# Altium footprint library texas.PCBLIB: 124 footprints (part 12 of 12)
Each footprint in its own frame and in the unit in brackets; x right, y up, seen from the top. Pads: shape width x height; smd on the part's side, far side on the other; paste and mask are expansions set on the pad; w line width, h text height; cw(c..) or ccw(c..) is an arc to the next point about the centre after c.
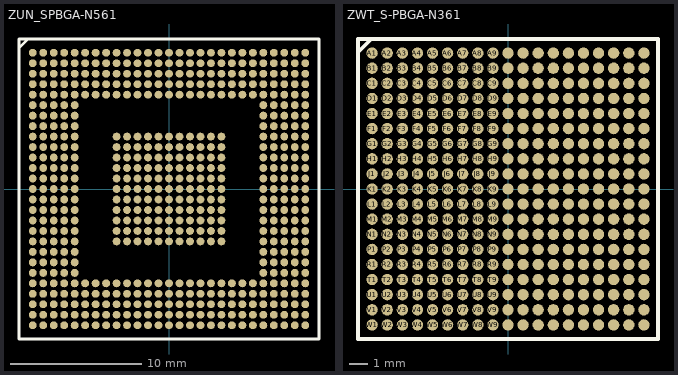
[diagram p11: the footprints below, top view; thin cyan lines are the x and y axes]

## ZUN_SPBGA-N561 [mm]
pads (561):
  rrect100% 0.6x0.6 smd: A1(-10.4,10.4) A2(-9.6,10.4) A3(-8.8,10.4) A4(-8,10.4) A5(-7.2,10.4) A6(-6.4,10.4) A7(-5.6,10.4) A8(-4.8,10.4) A9(-4,10.4) A10(-3.2,10.4) A11(-2.4,10.4) A12(-1.6,10.4) A13(-0.8,10.4) A14(0,10.4) A15(0.8,10.4) A16(1.6,10.4) A17(2.4,10.4) A18(3.2,10.4) A19(4,10.4) A20(4.8,10.4) A21(5.6,10.4) A22(6.4,10.4) A23(7.2,10.4) A24(8,10.4) A25(8.8,10.4) A26(9.6,10.4) A27(10.4,10.4) AA1(-10.4,-5.6) AA2(-9.6,-5.6) AA3(-8.8,-5.6) AA4(-8,-5.6) AA5(-7.2,-5.6) AA23(7.2,-5.6) AA24(8,-5.6) AA25(8.8,-5.6) AA26(9.6,-5.6) AA27(10.4,-5.6) AB1(-10.4,-6.4) AB2(-9.6,-6.4) AB3(-8.8,-6.4) AB4(-8,-6.4) AB5(-7.2,-6.4) AB23(7.2,-6.4) AB24(8,-6.4) AB25(8.8,-6.4) AB26(9.6,-6.4) AB27(10.4,-6.4) AC1(-10.4,-7.2) AC2(-9.6,-7.2) AC3(-8.8,-7.2) AC4(-8,-7.2) AC5(-7.2,-7.2) AC6(-6.4,-7.2) AC7(-5.6,-7.2) AC8(-4.8,-7.2) AC9(-4,-7.2) AC10(-3.2,-7.2) AC11(-2.4,-7.2) AC12(-1.6,-7.2) AC13(-0.8,-7.2) AC14(0,-7.2) AC15(0.8,-7.2) AC16(1.6,-7.2) AC17(2.4,-7.2) AC18(3.2,-7.2) AC19(4,-7.2) AC20(4.8,-7.2) AC21(5.6,-7.2) AC22(6.4,-7.2) AC23(7.2,-7.2) AC24(8,-7.2) AC25(8.8,-7.2) AC26(9.6,-7.2) AC27(10.4,-7.2) AD1(-10.4,-8) AD2(-9.6,-8) AD3(-8.8,-8) AD4(-8,-8) AD5(-7.2,-8) AD6(-6.4,-8) AD7(-5.6,-8) AD8(-4.8,-8) AD9(-4,-8) AD10(-3.2,-8) AD11(-2.4,-8) AD12(-1.6,-8) AD13(-0.8,-8) AD14(0,-8) AD15(0.8,-8) AD16(1.6,-8) AD17(2.4,-8) AD18(3.2,-8) AD19(4,-8) AD20(4.8,-8) AD21(5.6,-8) AD22(6.4,-8) AD23(7.2,-8) AD24(8,-8) AD25(8.8,-8) AD26(9.6,-8) AD27(10.4,-8) AE1(-10.4,-8.8) AE2(-9.6,-8.8) AE3(-8.8,-8.8) AE4(-8,-8.8) AE5(-7.2,-8.8) AE6(-6.4,-8.8) AE7(-5.6,-8.8) AE8(-4.8,-8.8) AE9(-4,-8.8) AE10(-3.2,-8.8) AE11(-2.4,-8.8) AE12(-1.6,-8.8) AE13(-0.8,-8.8) AE14(0,-8.8) AE15(0.8,-8.8) AE16(1.6,-8.8) AE17(2.4,-8.8) AE18(3.2,-8.8) AE19(4,-8.8) AE20(4.8,-8.8) AE21(5.6,-8.8) AE22(6.4,-8.8) AE23(7.2,-8.8) AE24(8,-8.8) AE25(8.8,-8.8) AE26(9.6,-8.8) AE27(10.4,-8.8) AF1(-10.4,-9.6) AF2(-9.6,-9.6) AF3(-8.8,-9.6) AF4(-8,-9.6) AF5(-7.2,-9.6) AF6(-6.4,-9.6) AF7(-5.6,-9.6) AF8(-4.8,-9.6) AF9(-4,-9.6) AF10(-3.2,-9.6) AF11(-2.4,-9.6) AF12(-1.6,-9.6) AF13(-0.8,-9.6) AF14(0,-9.6) AF15(0.8,-9.6) AF16(1.6,-9.6) AF17(2.4,-9.6) AF18(3.2,-9.6) AF19(4,-9.6) AF20(4.8,-9.6) AF21(5.6,-9.6) AF22(6.4,-9.6) AF23(7.2,-9.6) AF24(8,-9.6) AF25(8.8,-9.6) AF26(9.6,-9.6) AF27(10.4,-9.6) AG1(-10.4,-10.4) AG2(-9.6,-10.4) AG3(-8.8,-10.4) AG4(-8,-10.4) AG5(-7.2,-10.4) AG6(-6.4,-10.4) AG7(-5.6,-10.4) AG8(-4.8,-10.4) AG9(-4,-10.4) AG10(-3.2,-10.4) AG11(-2.4,-10.4) AG12(-1.6,-10.4) AG13(-0.8,-10.4) AG14(0,-10.4) AG15(0.8,-10.4) AG16(1.6,-10.4) AG17(2.4,-10.4) AG18(3.2,-10.4) AG19(4,-10.4) AG20(4.8,-10.4) AG21(5.6,-10.4) AG22(6.4,-10.4) AG23(7.2,-10.4) AG24(8,-10.4) AG25(8.8,-10.4) AG26(9.6,-10.4) AG27(10.4,-10.4) B1(-10.4,9.6) B2(-9.6,9.6) B3(-8.8,9.6) B4(-8,9.6) B5(-7.2,9.6) B6(-6.4,9.6) B7(-5.6,9.6) B8(-4.8,9.6) B9(-4,9.6) B10(-3.2,9.6) B11(-2.4,9.6) B12(-1.6,9.6) B13(-0.8,9.6) B14(0,9.6) B15(0.8,9.6) B16(1.6,9.6) B17(2.4,9.6) B18(3.2,9.6) B19(4,9.6) B20(4.8,9.6) B21(5.6,9.6) B22(6.4,9.6) B23(7.2,9.6) B24(8,9.6) B25(8.8,9.6) B26(9.6,9.6) B27(10.4,9.6) C1(-10.4,8.8) C2(-9.6,8.8) C3(-8.8,8.8) C4(-8,8.8) C5(-7.2,8.8) C6(-6.4,8.8) C7(-5.6,8.8) C8(-4.8,8.8) C9(-4,8.8) C10(-3.2,8.8) C11(-2.4,8.8) C12(-1.6,8.8) C13(-0.8,8.8) C14(0,8.8) C15(0.8,8.8) C16(1.6,8.8) C17(2.4,8.8) C18(3.2,8.8) C19(4,8.8) C20(4.8,8.8) C21(5.6,8.8) C22(6.4,8.8) C23(7.2,8.8) C24(8,8.8) C25(8.8,8.8) C26(9.6,8.8) C27(10.4,8.8) D1(-10.4,8) D2(-9.6,8) D3(-8.8,8) D4(-8,8) D5(-7.2,8) D6(-6.4,8) D7(-5.6,8) D8(-4.8,8) D9(-4,8) D10(-3.2,8) D11(-2.4,8) D12(-1.6,8) D13(-0.8,8) D14(0,8) D15(0.8,8) D16(1.6,8) D17(2.4,8) D18(3.2,8) D19(4,8) D20(4.8,8) D21(5.6,8) D22(6.4,8) D23(7.2,8) D24(8,8) D25(8.8,8) D26(9.6,8) D27(10.4,8) E1(-10.4,7.2) E2(-9.6,7.2) E3(-8.8,7.2) E4(-8,7.2) E5(-7.2,7.2) E6(-6.4,7.2) E7(-5.6,7.2) E8(-4.8,7.2) E9(-4,7.2) E10(-3.2,7.2) E11(-2.4,7.2) E12(-1.6,7.2) E13(-0.8,7.2) E14(0,7.2) E15(0.8,7.2) E16(1.6,7.2) E17(2.4,7.2) E18(3.2,7.2) E19(4,7.2) E20(4.8,7.2) E21(5.6,7.2) E22(6.4,7.2) E23(7.2,7.2) E24(8,7.2) E25(8.8,7.2) E26(9.6,7.2) E27(10.4,7.2) F1(-10.4,6.4) F2(-9.6,6.4) F3(-8.8,6.4) F4(-8,6.4) F5(-7.2,6.4) F23(7.2,6.4) F24(8,6.4) F25(8.8,6.4) F26(9.6,6.4) F27(10.4,6.4) G1(-10.4,5.6) G2(-9.6,5.6) G3(-8.8,5.6) G4(-8,5.6) G5(-7.2,5.6) G23(7.2,5.6) G24(8,5.6) G25(8.8,5.6) G26(9.6,5.6) G27(10.4,5.6) H1(-10.4,4.8) H2(-9.6,4.8) H3(-8.8,4.8) H4(-8,4.8) H5(-7.2,4.8) H23(7.2,4.8) H24(8,4.8) H25(8.8,4.8) H26(9.6,4.8) H27(10.4,4.8) J1(-10.4,4) J2(-9.6,4) J3(-8.8,4) J4(-8,4) J5(-7.2,4) J9(-4,4) J10(-3.2,4) J11(-2.4,4) J12(-1.6,4) J13(-0.8,4) J14(0,4) J15(0.8,4) J16(1.6,4) J17(2.4,4) J18(3.2,4) J19(4,4) J23(7.2,4) J24(8,4) J25(8.8,4) J26(9.6,4) J27(10.4,4) K1(-10.4,3.2) K2(-9.6,3.2) K3(-8.8,3.2) K4(-8,3.2) K5(-7.2,3.2) K9(-4,3.2) K10(-3.2,3.2) K11(-2.4,3.2) K12(-1.6,3.2) K13(-0.8,3.2) K14(0,3.2) K15(0.8,3.2) K16(1.6,3.2) K17(2.4,3.2) K18(3.2,3.2) K19(4,3.2) K23(7.2,3.2) K24(8,3.2) K25(8.8,3.2) K26(9.6,3.2) K27(10.4,3.2) L1(-10.4,2.4) L2(-9.6,2.4) L3(-8.8,2.4) L4(-8,2.4) L5(-7.2,2.4) L9(-4,2.4) L10(-3.2,2.4) L11(-2.4,2.4) L12(-1.6,2.4) L13(-0.8,2.4) L14(0,2.4) L15(0.8,2.4) L16(1.6,2.4) L17(2.4,2.4) L18(3.2,2.4) L19(4,2.4) L23(7.2,2.4) L24(8,2.4) L25(8.8,2.4) L26(9.6,2.4) L27(10.4,2.4) M1(-10.4,1.6) M2(-9.6,1.6) M3(-8.8,1.6) M4(-8,1.6) M5(-7.2,1.6) M9(-4,1.6) M10(-3.2,1.6) M11(-2.4,1.6) M12(-1.6,1.6) M13(-0.8,1.6) M14(0,1.6) M15(0.8,1.6) M16(1.6,1.6) M17(2.4,1.6) M18(3.2,1.6) M19(4,1.6) M23(7.2,1.6) M24(8,1.6) M25(8.8,1.6) M26(9.6,1.6) M27(10.4,1.6) N1(-10.4,0.8) N2(-9.6,0.8) N3(-8.8,0.8) N4(-8,0.8) N5(-7.2,0.8) N9(-4,0.8) N10(-3.2,0.8) N11(-2.4,0.8) N12(-1.6,0.8) N13(-0.8,0.8) N14(0,0.8) N15(0.8,0.8) N16(1.6,0.8) N17(2.4,0.8) N18(3.2,0.8) N19(4,0.8) N23(7.2,0.8) N24(8,0.8) N25(8.8,0.8) N26(9.6,0.8) N27(10.4,0.8) P1(-10.4,0) P2(-9.6,0) P3(-8.8,0) P4(-8,0) P5(-7.2,0) P9(-4,0) P10(-3.2,0) P11(-2.4,0) P12(-1.6,0) P13(-0.8,0) P14(0,0) P15(0.8,0) P16(1.6,0) P17(2.4,0) P18(3.2,0) P19(4,0) P23(7.2,0) P24(8,0) P25(8.8,0) P26(9.6,0) P27(10.4,0) R1(-10.4,-0.8) R2(-9.6,-0.8) R3(-8.8,-0.8) R4(-8,-0.8) R5(-7.2,-0.8) R9(-4,-0.8) R10(-3.2,-0.8) R11(-2.4,-0.8) R12(-1.6,-0.8) R13(-0.8,-0.8) R14(0,-0.8) R15(0.8,-0.8) R16(1.6,-0.8) R17(2.4,-0.8) R18(3.2,-0.8) R19(4,-0.8) R23(7.2,-0.8) R24(8,-0.8) R25(8.8,-0.8) R26(9.6,-0.8) R27(10.4,-0.8) T1(-10.4,-1.6) T2(-9.6,-1.6) T3(-8.8,-1.6) T4(-8,-1.6) T5(-7.2,-1.6) T9(-4,-1.6) T10(-3.2,-1.6) T11(-2.4,-1.6) T12(-1.6,-1.6) T13(-0.8,-1.6) T14(0,-1.6) T15(0.8,-1.6) T16(1.6,-1.6) T17(2.4,-1.6) T18(3.2,-1.6) T19(4,-1.6) T23(7.2,-1.6) T24(8,-1.6) T25(8.8,-1.6) T26(9.6,-1.6) T27(10.4,-1.6) U1(-10.4,-2.4) U2(-9.6,-2.4) U3(-8.8,-2.4) U4(-8,-2.4) U5(-7.2,-2.4) U9(-4,-2.4) U10(-3.2,-2.4) U11(-2.4,-2.4) U12(-1.6,-2.4) U13(-0.8,-2.4) U14(0,-2.4) U15(0.8,-2.4) U16(1.6,-2.4) U17(2.4,-2.4) U18(3.2,-2.4) U19(4,-2.4) U23(7.2,-2.4) U24(8,-2.4) U25(8.8,-2.4) U26(9.6,-2.4) U27(10.4,-2.4) V1(-10.4,-3.2) V2(-9.6,-3.2) V3(-8.8,-3.2) V4(-8,-3.2) V5(-7.2,-3.2) V9(-4,-3.2) V10(-3.2,-3.2) V11(-2.4,-3.2) V12(-1.6,-3.2) V13(-0.8,-3.2) V14(0,-3.2) V15(0.8,-3.2) V16(1.6,-3.2) V17(2.4,-3.2) V18(3.2,-3.2) V19(4,-3.2) V23(7.2,-3.2) V24(8,-3.2) V25(8.8,-3.2) V26(9.6,-3.2) V27(10.4,-3.2) W1(-10.4,-4) W2(-9.6,-4) W3(-8.8,-4) W4(-8,-4) W5(-7.2,-4) W9(-4,-4) W10(-3.2,-4) W11(-2.4,-4) W12(-1.6,-4) W13(-0.8,-4) W14(0,-4) W15(0.8,-4) W16(1.6,-4) W17(2.4,-4) W18(3.2,-4) W19(4,-4) W23(7.2,-4) W24(8,-4) W25(8.8,-4) W26(9.6,-4) W27(10.4,-4) Y1(-10.4,-4.8) Y2(-9.6,-4.8) Y3(-8.8,-4.8) Y4(-8,-4.8) Y5(-7.2,-4.8) Y23(7.2,-4.8) Y24(8,-4.8) Y25(8.8,-4.8) Y26(9.6,-4.8) Y27(10.4,-4.8)
Top Overlay:
  lines w0.203: -11.448,10.75 -11.448,11.448 -10.75,11.448 ; -11.448,10.75 -11.448,-11.448 11.448,-11.448 11.448,11.448 -10.75,11.448 ; -11.448,10.75 -10.75,11.448
Top Solder:
  drawing of 561 lines, arcs and shapes, not listed

## ZWT_S-PBGA-N361 [mm]
pads (361):
  rrect100% 0.6x0.6 smd: A1(-7.2,7.2) A2(-6.4,7.2) A3(-5.6,7.2) A4(-4.8,7.2) A5(-4,7.2) A6(-3.2,7.2) A7(-2.4,7.2) A8(-1.6,7.2) A9(-0.8,7.2) A10(0,7.2) A11(0.8,7.2) A12(1.6,7.2) A13(2.4,7.2) A14(3.2,7.2) A15(4,7.2) A16(4.8,7.2) A17(5.6,7.2) A18(6.4,7.2) A19(7.2,7.2) B1(-7.2,6.4) B2(-6.4,6.4) B3(-5.6,6.4) B4(-4.8,6.4) B5(-4,6.4) B6(-3.2,6.4) B7(-2.4,6.4) B8(-1.6,6.4) B9(-0.8,6.4) B10(0,6.4) B11(0.8,6.4) B12(1.6,6.4) B13(2.4,6.4) B14(3.2,6.4) B15(4,6.4) B16(4.8,6.4) B17(5.6,6.4) B18(6.4,6.4) B19(7.2,6.4) C1(-7.2,5.6) C2(-6.4,5.6) C3(-5.6,5.6) C4(-4.8,5.6) C5(-4,5.6) C6(-3.2,5.6) C7(-2.4,5.6) C8(-1.6,5.6) C9(-0.8,5.6) C10(0,5.6) C11(0.8,5.6) C12(1.6,5.6) C13(2.4,5.6) C14(3.2,5.6) C15(4,5.6) C16(4.8,5.6) C17(5.6,5.6) C18(6.4,5.6) C19(7.2,5.6) D1(-7.2,4.8) D2(-6.4,4.8) D3(-5.6,4.8) D4(-4.8,4.8) D5(-4,4.8) D6(-3.2,4.8) D7(-2.4,4.8) D8(-1.6,4.8) D9(-0.8,4.8) D10(0,4.8) D11(0.8,4.8) D12(1.6,4.8) D13(2.4,4.8) D14(3.2,4.8) D15(4,4.8) D16(4.8,4.8) D17(5.6,4.8) D18(6.4,4.8) D19(7.2,4.8) E1(-7.2,4) E2(-6.4,4) E3(-5.6,4) E4(-4.8,4) E5(-4,4) E6(-3.2,4) E7(-2.4,4) E8(-1.6,4) E9(-0.8,4) E10(0,4) E11(0.8,4) E12(1.6,4) E13(2.4,4) E14(3.2,4) E15(4,4) E16(4.8,4) E17(5.6,4) E18(6.4,4) E19(7.2,4) F1(-7.2,3.2) F2(-6.4,3.2) F3(-5.6,3.2) F4(-4.8,3.2) F5(-4,3.2) F6(-3.2,3.2) F7(-2.4,3.2) F8(-1.6,3.2) F9(-0.8,3.2) F10(0,3.2) F11(0.8,3.2) F12(1.6,3.2) F13(2.4,3.2) F14(3.2,3.2) F15(4,3.2) F16(4.8,3.2) F17(5.6,3.2) F18(6.4,3.2) F19(7.2,3.2) G1(-7.2,2.4) G2(-6.4,2.4) G3(-5.6,2.4) G4(-4.8,2.4) G5(-4,2.4) G6(-3.2,2.4) G7(-2.4,2.4) G8(-1.6,2.4) G9(-0.8,2.4) G10(0,2.4) G11(0.8,2.4) G12(1.6,2.4) G13(2.4,2.4) G14(3.2,2.4) G15(4,2.4) G16(4.8,2.4) G17(5.6,2.4) G18(6.4,2.4) G19(7.2,2.4) H1(-7.2,1.6) H2(-6.4,1.6) H3(-5.6,1.6) H4(-4.8,1.6) H5(-4,1.6) H6(-3.2,1.6) H7(-2.4,1.6) H8(-1.6,1.6) H9(-0.8,1.6) H10(0,1.6) H11(0.8,1.6) H12(1.6,1.6) H13(2.4,1.6) H14(3.2,1.6) H15(4,1.6) H16(4.8,1.6) H17(5.6,1.6) H18(6.4,1.6) H19(7.2,1.6) J1(-7.2,0.8) J2(-6.4,0.8) J3(-5.6,0.8) J4(-4.8,0.8) J5(-4,0.8) J6(-3.2,0.8) J7(-2.4,0.8) J8(-1.6,0.8) J9(-0.8,0.8) J10(0,0.8) J11(0.8,0.8) J12(1.6,0.8) J13(2.4,0.8) J14(3.2,0.8) J15(4,0.8) J16(4.8,0.8) J17(5.6,0.8) J18(6.4,0.8) J19(7.2,0.8) K1(-7.2,0) K2(-6.4,0) K3(-5.6,0) K4(-4.8,0) K5(-4,0) K6(-3.2,0) K7(-2.4,0) K8(-1.6,0) K9(-0.8,0) K10(0,0) K11(0.8,0) K12(1.6,0) K13(2.4,0) K14(3.2,0) K15(4,0) K16(4.8,0) K17(5.6,0) K18(6.4,0) K19(7.2,0) L1(-7.2,-0.8) L2(-6.4,-0.8) L3(-5.6,-0.8) L4(-4.8,-0.8) L5(-4,-0.8) L6(-3.2,-0.8) L7(-2.4,-0.8) L8(-1.6,-0.8) L9(-0.8,-0.8) L10(0,-0.8) L11(0.8,-0.8) L12(1.6,-0.8) L13(2.4,-0.8) L14(3.2,-0.8) L15(4,-0.8) L16(4.8,-0.8) L17(5.6,-0.8) L18(6.4,-0.8) L19(7.2,-0.8) M1(-7.2,-1.6) M2(-6.4,-1.6) M3(-5.6,-1.6) M4(-4.8,-1.6) M5(-4,-1.6) M6(-3.2,-1.6) M7(-2.4,-1.6) M8(-1.6,-1.6) M9(-0.8,-1.6) M10(0,-1.6) M11(0.8,-1.6) M12(1.6,-1.6) M13(2.4,-1.6) M14(3.2,-1.6) M15(4,-1.6) M16(4.8,-1.6) M17(5.6,-1.6) M18(6.4,-1.6) M19(7.2,-1.6) N1(-7.2,-2.4) N2(-6.4,-2.4) N3(-5.6,-2.4) N4(-4.8,-2.4) N5(-4,-2.4) N6(-3.2,-2.4) N7(-2.4,-2.4) N8(-1.6,-2.4) N9(-0.8,-2.4) N10(0,-2.4) N11(0.8,-2.4) N12(1.6,-2.4) N13(2.4,-2.4) N14(3.2,-2.4) N15(4,-2.4) N16(4.8,-2.4) N17(5.6,-2.4) N18(6.4,-2.4) N19(7.2,-2.4) P1(-7.2,-3.2) P2(-6.4,-3.2) P3(-5.6,-3.2) P4(-4.8,-3.2) P5(-4,-3.2) P6(-3.2,-3.2) P7(-2.4,-3.2) P8(-1.6,-3.2) P9(-0.8,-3.2) P10(0,-3.2) P11(0.8,-3.2) P12(1.6,-3.2) P13(2.4,-3.2) P14(3.2,-3.2) P15(4,-3.2) P16(4.8,-3.2) P17(5.6,-3.2) P18(6.4,-3.2) P19(7.2,-3.2) R1(-7.2,-4) R2(-6.4,-4) R3(-5.6,-4) R4(-4.8,-4) R5(-4,-4) R6(-3.2,-4) R7(-2.4,-4) R8(-1.6,-4) R9(-0.8,-4) R10(0,-4) R11(0.8,-4) R12(1.6,-4) R13(2.4,-4) R14(3.2,-4) R15(4,-4) R16(4.8,-4) R17(5.6,-4) R18(6.4,-4) R19(7.2,-4) T1(-7.2,-4.8) T2(-6.4,-4.8) T3(-5.6,-4.8) T4(-4.8,-4.8) T5(-4,-4.8) T6(-3.2,-4.8) T7(-2.4,-4.8) T8(-1.6,-4.8) T9(-0.8,-4.8) T10(0,-4.8) T11(0.8,-4.8) T12(1.6,-4.8) T13(2.4,-4.8) T14(3.2,-4.8) T15(4,-4.8) T16(4.8,-4.8) T17(5.6,-4.8) T18(6.4,-4.8) T19(7.2,-4.8) U1(-7.2,-5.6) U2(-6.4,-5.6) U3(-5.6,-5.6) U4(-4.8,-5.6) U5(-4,-5.6) U6(-3.2,-5.6) U7(-2.4,-5.6) U8(-1.6,-5.6) U9(-0.8,-5.6) U10(0,-5.6) U11(0.8,-5.6) U12(1.6,-5.6) U13(2.4,-5.6) U14(3.2,-5.6) U15(4,-5.6) U16(4.8,-5.6) U17(5.6,-5.6) U18(6.4,-5.6) U19(7.2,-5.6) V1(-7.2,-6.4) V2(-6.4,-6.4) V3(-5.6,-6.4) V4(-4.8,-6.4) V5(-4,-6.4) V6(-3.2,-6.4) V7(-2.4,-6.4) V8(-1.6,-6.4) V9(-0.8,-6.4) V10(0,-6.4) V11(0.8,-6.4) V12(1.6,-6.4) V13(2.4,-6.4) V14(3.2,-6.4) V15(4,-6.4) V16(4.8,-6.4) V17(5.6,-6.4) V18(6.4,-6.4) V19(7.2,-6.4) W1(-7.2,-7.2) W2(-6.4,-7.2) W3(-5.6,-7.2) W4(-4.8,-7.2) W5(-4,-7.2) W6(-3.2,-7.2) W7(-2.4,-7.2) W8(-1.6,-7.2) W9(-0.8,-7.2) W10(0,-7.2) W11(0.8,-7.2) W12(1.6,-7.2) W13(2.4,-7.2) W14(3.2,-7.2) W15(4,-7.2) W16(4.8,-7.2) W17(5.6,-7.2) W18(6.4,-7.2) W19(7.2,-7.2)
Top Overlay:
  lines w0.203: -7.948,7.25 -7.948,7.948 -7.25,7.948 ; -7.948,7.25 -7.948,-7.948 7.948,-7.948 7.948,7.948 -7.25,7.948 ; -7.948,7.25 -7.25,7.948
Top Solder:
  drawing of 361 lines, arcs and shapes, not listed